# Altium footprint library 3M THD.PcbLib: 163 footprints (part 8 of 14)
Each footprint in its own frame and in the unit in brackets; x right, y up, seen from the top. Pads: shape width x height; smd on the part's side, far side on the other; paste and mask are expansions set on the pad; w line width, h text height; cw(c..) or ccw(c..) is an arc to the next point about the centre after c.
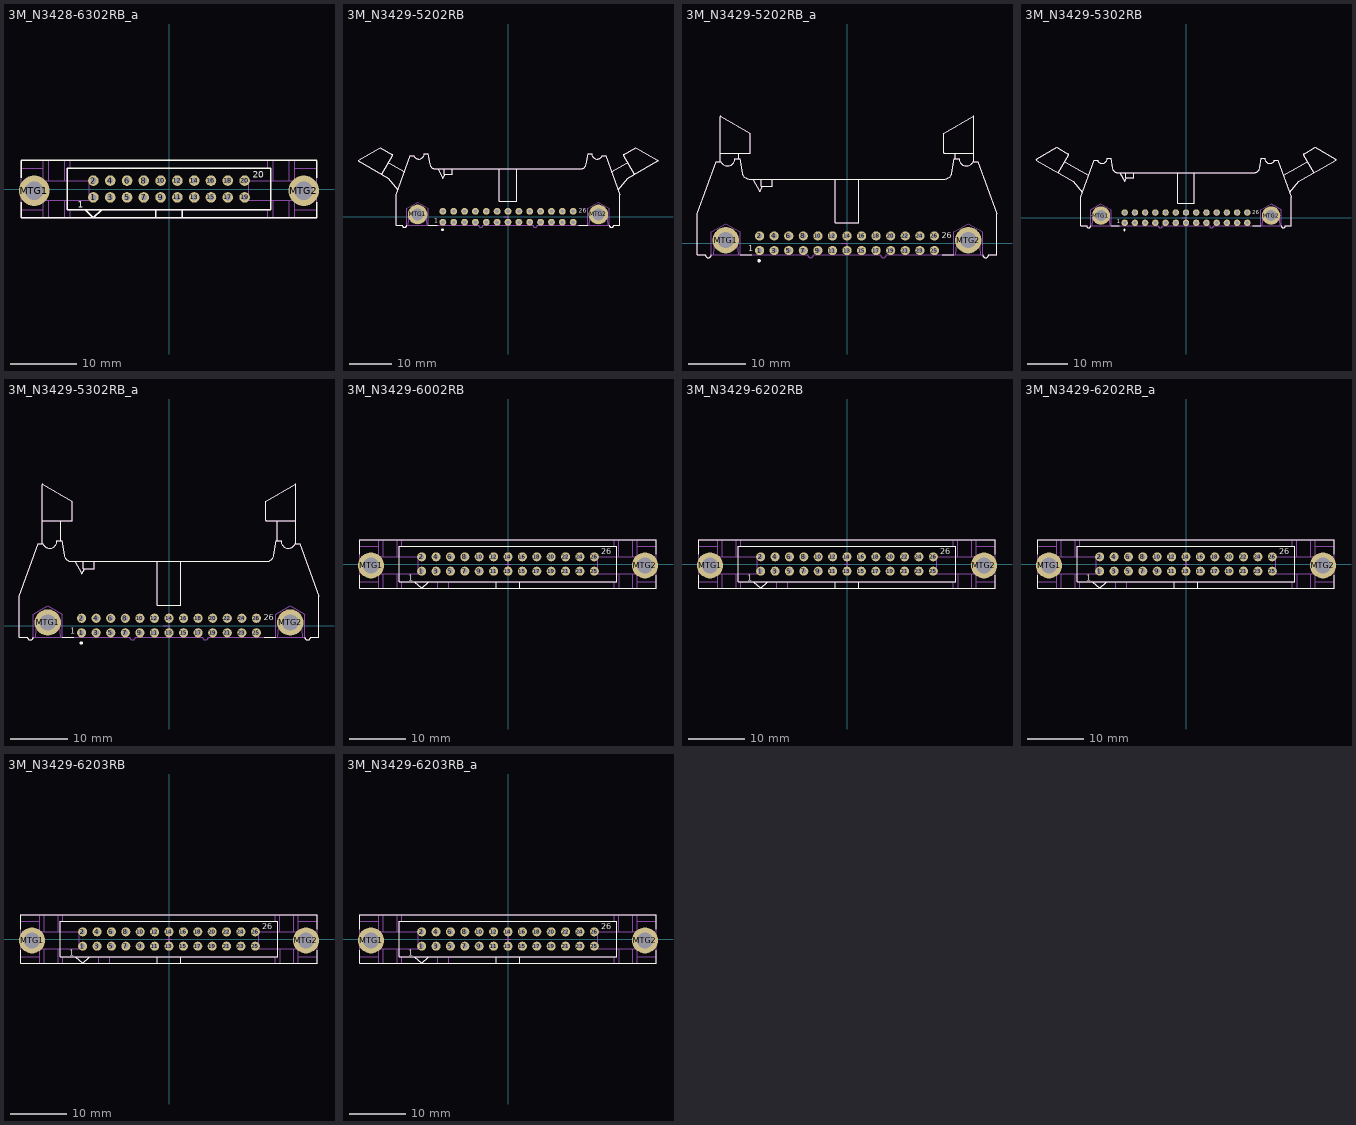
[diagram p7: the footprints below, top view; thin cyan lines are the x and y axes]

## 3M_N3428-6302RB_a [mm] "3M, 3000 Series, 20 Contacts - Pitch 2.54mm - Straight Four-Wall Header (Black) With Long Roll Pin Latch/Ejectors"
height 27.2
pads (22):
  round 1.6 hole 0.9: 1(-11.43,-1.27) 2(-11.43,1.27) 3(-8.89,-1.27) 4(-8.89,1.27) 5(-6.35,-1.27) 6(-6.35,1.27) 7(-3.81,-1.27) 8(-3.81,1.27) 9(-1.27,-1.27) 10(-1.27,1.27) 11(1.27,-1.27) 12(1.27,1.27) 13(3.81,-1.27) 14(3.81,1.27) 15(6.35,-1.27) 16(6.35,1.27) 17(8.89,-1.27) 18(8.89,1.27) 19(11.43,-1.27) 20(11.43,1.27)
  round 4.6 hole 2.8: MTG1(-20.384,-0.254) MTG2(20.384,-0.254)
Top Overlay:
  lines w0.2: -22.352,-2 -22.352,-4.318 22.352,-4.318 22.352,-2 ; -22.352,1.7 -22.352,4.3 ; -22.352,4.318 22.352,4.318 ; -12.7,-3.175 -11.43,-4.318 -10.16,-3.175 ; -2.032,-4.318 -2.032,-3.175 ; 2.032,-4.318 2.032,-3.175 ; 22.352,1.7 22.352,4.3 ; -15.367,-3.175 15.367,-3.175 15.367,3.175 -15.367,3.175 -15.367,-3.175
  text "1" at -13.767,-2.871 h1.02
  text "20" at 12.665,1.727 h1.02
Mechanical 14:
  circle w0.1: c-20.384,-0.254 r1.27
  circle w0.1: c20.384,-0.254 r1.27
  lines w0.1: -22.352,-3.175 -19.024,-3.175 ; -21.384,-0.254 -20.384,-0.254 ; -20.384,-1.254 -20.384,-0.254 ; -20.384,0.746 -20.384,-0.254 ; -19.384,-0.254 -20.384,-0.254 ; -19.024,-4.318 -19.024,-1.727 -12.065,-1.727 -12.065,1.27 -19.024,1.27 -19.024,4.318 ; -18.182,-4.318 -18.182,-1.727 ; -18.182,1.27 -18.182,4.318 ; -15.749,-4.318 -15.748,-1.727 ; -15.367,-1.727 -15.367,-3.175 15.367,-3.175 15.367,-1.727 ; -15.367,1.27 -15.367,3.175 15.367,3.175 15.367,1.27 ; -2.032,-4.318 -2.032,-3.175 ; 2.032,-4.318 2.032,-3.175 ; 14.906,-4.318 14.906,-3.175 ; 14.906,3.175 14.906,4.318 ; 15.748,1.27 15.748,4.318 ; 15.789,-4.318 15.789,-1.727 ; 18.182,-4.318 18.182,-1.727 ; 18.182,1.27 18.182,4.318 ; 19.024,-4.318 19.024,-1.727 12.065,-1.727 12.065,1.27 19.024,1.27 19.024,4.318 ; 19.024,-3.175 22.352,-3.175 ; 19.024,3.175 22.352,3.175 ; 19.384,-0.254 20.384,-0.254 ; 20.384,-1.254 20.384,-0.254 ; 20.384,0.746 20.384,-0.254 ; 21.384,-0.254 20.384,-0.254 ; -22.352,-4.318 22.352,-4.318 22.352,4.318 -22.352,4.318 -22.352,-4.318 ; -22.352,3.175 -19.024,3.175 -22.352,3.175 ; -21.908,-1.134 -21.908,0.626 -20.384,1.506 -18.86,0.626 -18.86,-1.134 -20.384,-2.014 -21.908,-1.134 ; -15.748,1.27 -15.748,4.318 -15.748,1.27 ; -14.906,-4.318 -14.906,-3.175 -14.906,-4.318 ; -14.906,3.175 -14.906,4.318 -14.906,3.175 ; -12.7,-3.175 -11.43,-4.318 -10.16,-3.175 -12.7,-3.175 ; 18.86,-1.134 18.86,0.626 20.384,1.506 21.908,0.626 21.908,-1.134 20.384,-2.014 18.86,-1.134
  text "20" at 12.665,1.727 h1.02
  text "1" at -13.767,-2.871 h1.02
3D body "3M_N3428-6302RB_a.stp": height 27.18, standoff -2.84, extent -22.352,-4.318 22.352,4.318

## 3M_N3429-5202RB [mm] "3M, 3000 Series, 26 Contacts - Pitch 2.54mm - Right Angle Four-Wall Header (Black) With Short Roll Pin Latch/Ejectors"
height 8.6
pads (28):
  round 1.6 hole 0.9: 1(-15.24,-1.27) 2(-15.24,1.27) 3(-12.7,-1.27) 4(-12.7,1.27) 5(-10.16,-1.27) 6(-10.16,1.27) 7(-7.62,-1.27) 8(-7.62,1.27) 9(-5.08,-1.27) 10(-5.08,1.27) 11(-2.54,-1.27) 12(-2.54,1.27) 13(0,-1.27) 14(0,1.27) 15(2.54,-1.27) 16(2.54,1.27) 17(5.08,-1.27) 18(5.08,1.27) 19(7.62,-1.27) 20(7.62,1.27) 21(10.16,-1.27) 22(10.16,1.27) 23(12.7,-1.27) 24(12.7,1.27) 25(15.24,-1.27) 26(15.24,1.27)
  round 4.6 hole 2.8: MTG1(-21.146,0.533) MTG2(21.146,0.533)
Top Overlay:
  circle w0.3: c-15.313,-3.048 r0.15
  lines w0.2: -29.561,9.892 -26.983,14.358 ccw(c-27.071,14.409) -27.02,14.497 -29.935,16.179 -35.04,13.232 ccw(c-34.989,13.144) -35.04,13.056 -28.051,9.02 -25.74,6.266 ; -27.948,12.686 -24.192,10.517 ; -24.702,-2.009 -26.162,-2.007 -26.162,5.105 -22.834,14.249 -21.992,14.249 ccw(c-20.828,14.757) -19.558,14.756 -18.716,14.757 -18.274,12.251 ccw(c-17.023,12.471) -17.023,11.201 17.023,11.201 ccw(c17.023,12.471) 18.274,12.251 18.716,14.757 19.558,14.757 ccw(c20.828,14.757) 21.992,14.249 22.834,14.249 26.162,5.105 26.162,-2.007 24.702,-2.007 cw(c24.194,-2.007) 23.686,-2.007 ; -24.702,-2.007 ccw(c-24.194,-2.007) -23.686,-2.007 ; -18.644,-1.999 -16.6,-2.005 ; -16.478,11.201 -15.208,9.002 -14.671,9.931 ; -14.929,11.201 -14.929,9.931 -13.011,9.931 -13.011,11.201 ; -2.032,11.201 -2.032,3.581 2.032,3.581 2.032,11.201 ; 16.6,-2.005 18.644,-2.005 ; 24.192,10.517 27.948,12.686 ; 25.74,6.266 28.051,9.02 35.04,13.056 ccw(c34.989,13.144) 35.04,13.232 29.935,16.179 27.02,14.497 ccw(c27.071,14.409) 26.983,14.358 29.561,9.892
  text "26" at 16.5,0.889 h1.02
  text "1" at -17.2,-1.399 h1.02
Mechanical 8:
  circle w0.05: c15.24,1.27 r0.5
  circle w0.05: c12.7,1.27 r0.5
  circle w0.05: c10.16,1.27 r0.5
  circle w0.05: c7.62,1.27 r0.5
  circle w0.05: c5.08,1.27 r0.5
  circle w0.05: c2.54,1.27 r0.5
  circle w0.05: c0,1.27 r0.5
  circle w0.05: c-2.54,1.27 r0.5
  circle w0.05: c-5.08,1.27 r0.5
  circle w0.05: c-7.62,1.27 r0.5
  circle w0.05: c-10.16,1.27 r0.5
  circle w0.05: c-12.7,1.27 r0.5
  circle w0.05: c-15.24,1.27 r0.5
  circle w0.05: c-15.24,-1.27 r0.5
  circle w0.05: c-12.7,-1.27 r0.5
  circle w0.05: c-10.16,-1.27 r0.5
  circle w0.05: c-7.62,-1.27 r0.5
  circle w0.05: c-5.08,-1.27 r0.5
  circle w0.05: c-2.54,-1.27 r0.5
  circle w0.05: c0,-1.27 r0.5
  circle w0.05: c2.54,-1.27 r0.5
  circle w0.05: c5.08,-1.27 r0.5
  circle w0.05: c7.62,-1.27 r0.5
  circle w0.05: c10.16,-1.27 r0.5
  circle w0.05: c12.7,-1.27 r0.5
  circle w0.05: c15.24,-1.27 r0.5
  circle w0.1: c21.146,0.533 r1.3
  circle w0.05: c-21.146,0.533 r1.3
  lines w0.05: -1,0 0,0 0,-1
Mechanical 14:
  lines w0.1: -29.561,9.892 -26.983,14.358 ccw(c-27.071,14.409) -27.02,14.497 -29.935,16.179 -35.04,13.232 ccw(c-34.989,13.144) -35.04,13.056 -28.051,9.02 -25.74,6.266 ; -27.948,12.686 -24.192,10.517 ; -24.702,-2.009 -26.162,-2.007 -26.162,5.105 -22.834,14.249 -21.992,14.249 ccw(c-20.828,14.757) -19.558,14.756 -18.716,14.757 -18.274,12.251 ccw(c-17.023,12.471) -17.023,11.201 17.023,11.201 ccw(c17.023,12.471) 18.274,12.251 18.716,14.757 19.558,14.757 ccw(c20.828,14.757) 21.992,14.249 22.834,14.249 26.162,5.105 26.162,-2.007 24.702,-2.007 cw(c24.194,-2.007) 23.686,-2.007 6.858,-2.007 cw(c6.35,-2.007) 5.842,-2.007 -5.842,-2.007 cw(c-6.35,-2.007) -6.858,-2.007 -23.686,-2.007 cw(c-24.194,-2.007) -24.702,-2.007 ; -23.647,-2.007 -23.647,1.978 -21.146,3.422 -18.644,1.978 -18.644,-2.007 ; -23.28,-2.007 -23.043,0.699 cw(c-21.146,0.533) -19.248,0.699 -19.011,-2.007 ; -16.478,11.201 -15.208,9.002 -14.671,9.931 ; -14.929,11.201 -14.929,9.931 -13.011,9.931 -13.011,11.201 ; -2.032,11.201 -2.032,3.581 2.032,3.581 2.032,11.201 ; 18.644,-2.007 18.644,1.978 21.146,3.422 23.647,1.978 23.647,-2.007 ; 19.011,-2.007 19.248,0.699 cw(c21.146,0.533) 23.043,0.699 23.28,-2.007 ; 24.192,10.517 27.948,12.686 ; 25.74,6.266 28.051,9.02 35.04,13.056 ccw(c34.989,13.144) 35.04,13.232 29.935,16.179 27.02,14.497 ccw(c27.071,14.409) 26.983,14.358 29.561,9.892
  text "26" at 16.5,0.889 h1.02
  text "1" at -17.2,-1.399 h1.02
3D body "3M_N3429-5202RB.stp": height 8.64, standoff -2.84, extent -35.091,-2.513 35.091,16.181

## 3M_N3429-5202RB_a [mm] "3M, 3000 Series, 26 Contacts - Pitch 2.54mm - Right Angle Four-Wall Header (Black) With Short Roll Pin Latch/Ejectors"
height 8.6
pads (28):
  round 1.6 hole 0.9: 1(-15.24,-1.27) 2(-15.24,1.27) 3(-12.7,-1.27) 4(-12.7,1.27) 5(-10.16,-1.27) 6(-10.16,1.27) 7(-7.62,-1.27) 8(-7.62,1.27) 9(-5.08,-1.27) 10(-5.08,1.27) 11(-2.54,-1.27) 12(-2.54,1.27) 13(0,-1.27) 14(0,1.27) 15(2.54,-1.27) 16(2.54,1.27) 17(5.08,-1.27) 18(5.08,1.27) 19(7.62,-1.27) 20(7.62,1.27) 21(10.16,-1.27) 22(10.16,1.27) 23(12.7,-1.27) 24(12.7,1.27) 25(15.24,-1.27) 26(15.24,1.27)
  round 4.6 hole 2.8: MTG1(-21.146,0.533) MTG2(21.146,0.533)
Top Overlay:
  circle w0.3: c-15.313,-3.048 r0.15
  lines w0.2: -24.702,-2.009 -26.162,-2.007 -26.162,5.105 -22.834,14.249 -21.992,14.249 ccw(c-20.828,14.757) -19.558,14.756 -18.716,14.757 -18.274,12.251 ccw(c-17.023,12.471) -17.023,11.201 17.023,11.201 ccw(c17.023,12.471) 18.274,12.251 18.716,14.757 19.558,14.757 ccw(c20.828,14.757) 21.992,14.249 22.834,14.249 26.162,5.105 26.162,-2.007 24.702,-2.007 cw(c24.194,-2.007) 23.686,-2.007 ; -24.702,-2.007 ccw(c-24.194,-2.007) -23.686,-2.007 ; -22.149,14.249 -22.149,22.024 cw(c-22.047,22.024) -21.996,22.112 -16.891,19.164 -16.891,15.799 cw(c-16.993,15.799) -16.993,15.697 -22.149,15.697 ; -18.923,14.757 -18.923,15.697 ; -18.644,-1.999 -16.6,-2.005 ; -16.478,11.201 -15.208,9.002 -14.671,9.931 ; -14.929,11.201 -14.929,9.931 -13.011,9.931 -13.011,11.201 ; -2.032,11.201 -2.032,3.581 2.032,3.581 2.032,11.201 ; 16.6,-2.005 18.644,-2.005 ; 18.923,14.757 18.923,15.697 ; 22.149,14.249 22.149,22.024 ccw(c22.047,22.024) 21.996,22.112 16.891,19.164 16.891,15.799 ccw(c16.993,15.799) 16.993,15.697 22.149,15.697
  text "1" at -17.2,-1.399 h1.02
  text "26" at 16.5,0.889 h1.02
Mechanical 8:
  circle w0.05: c15.24,1.27 r0.5
  circle w0.05: c12.7,1.27 r0.5
  circle w0.05: c10.16,1.27 r0.5
  circle w0.05: c7.62,1.27 r0.5
  circle w0.05: c5.08,1.27 r0.5
  circle w0.05: c2.54,1.27 r0.5
  circle w0.05: c0,1.27 r0.5
  circle w0.05: c-2.54,1.27 r0.5
  circle w0.05: c-5.08,1.27 r0.5
  circle w0.05: c-7.62,1.27 r0.5
  circle w0.05: c-10.16,1.27 r0.5
  circle w0.05: c-12.7,1.27 r0.5
  circle w0.05: c-15.24,1.27 r0.5
  circle w0.05: c-15.24,-1.27 r0.5
  circle w0.05: c-12.7,-1.27 r0.5
  circle w0.05: c-10.16,-1.27 r0.5
  circle w0.05: c-7.62,-1.27 r0.5
  circle w0.05: c-5.08,-1.27 r0.5
  circle w0.05: c-2.54,-1.27 r0.5
  circle w0.05: c0,-1.27 r0.5
  circle w0.05: c2.54,-1.27 r0.5
  circle w0.05: c5.08,-1.27 r0.5
  circle w0.05: c7.62,-1.27 r0.5
  circle w0.05: c10.16,-1.27 r0.5
  circle w0.05: c12.7,-1.27 r0.5
  circle w0.05: c15.24,-1.27 r0.5
  circle w0.1: c21.146,0.533 r1.3
  circle w0.05: c-21.146,0.533 r1.3
  lines w0.05: -1,0 0,0 0,-1
Mechanical 14:
  lines w0.1: -24.702,-2.009 -26.162,-2.007 -26.162,5.105 -22.834,14.249 -21.992,14.249 ccw(c-20.828,14.757) -19.558,14.756 -18.716,14.757 -18.274,12.251 ccw(c-17.023,12.471) -17.023,11.201 17.023,11.201 ccw(c17.023,12.471) 18.274,12.251 18.716,14.757 19.558,14.757 ccw(c20.828,14.757) 21.992,14.249 22.834,14.249 26.162,5.105 26.162,-2.007 24.702,-2.007 cw(c24.194,-2.007) 23.686,-2.007 6.858,-2.007 cw(c6.35,-2.007) 5.842,-2.007 -5.842,-2.007 cw(c-6.35,-2.007) -6.858,-2.007 -23.686,-2.007 cw(c-24.194,-2.007) -24.702,-2.007 ; -23.647,-2.007 -23.647,1.978 -21.146,3.422 -18.644,1.978 -18.644,-2.007 ; -23.28,-2.007 -23.043,0.699 cw(c-21.146,0.533) -19.248,0.699 -19.011,-2.007 ; -22.149,14.249 -22.149,22.024 cw(c-22.047,22.024) -21.996,22.112 -16.891,19.164 -16.891,15.799 cw(c-16.993,15.799) -16.993,15.697 -22.149,15.697 ; -18.923,14.757 -18.923,15.697 ; -16.478,11.201 -15.208,9.002 -14.671,9.931 ; -14.929,11.201 -14.929,9.931 -13.011,9.931 -13.011,11.201 ; -2.032,11.201 -2.032,3.581 2.032,3.581 2.032,11.201 ; 18.644,-2.007 18.644,1.978 21.146,3.422 23.647,1.978 23.647,-2.007 ; 18.923,14.757 18.923,15.697 ; 19.011,-2.007 19.248,0.699 cw(c21.146,0.533) 23.043,0.699 23.28,-2.007 ; 22.149,14.249 22.149,22.024 ccw(c22.047,22.024) 21.996,22.112 16.891,19.164 16.891,15.799 ccw(c16.993,15.799) 16.993,15.697 22.149,15.697
  text "1" at -17.2,-1.399 h1.02
  text "26" at 16.5,0.889 h1.02
3D body "3M_N3429-5202RB_a.stp": height 8.64, standoff -2.84, extent -26.162,-2.513 26.162,22.127

## 3M_N3429-5302RB [mm] "3M, 3000 Series, 26 Contacts - Pitch 2.54mm - Right Angle Four-Wall Header (Black) With Long Roll Pin Latch/Ejectors"
height 8.6
pads (28):
  round 1.6 hole 0.9: 1(-15.24,-1.27) 2(-15.24,1.27) 3(-12.7,-1.27) 4(-12.7,1.27) 5(-10.16,-1.27) 6(-10.16,1.27) 7(-7.62,-1.27) 8(-7.62,1.27) 9(-5.08,-1.27) 10(-5.08,1.27) 11(-2.54,-1.27) 12(-2.54,1.27) 13(0,-1.27) 14(0,1.27) 15(2.54,-1.27) 16(2.54,1.27) 17(5.08,-1.27) 18(5.08,1.27) 19(7.62,-1.27) 20(7.62,1.27) 21(10.16,-1.27) 22(10.16,1.27) 23(12.7,-1.27) 24(12.7,1.27) 25(15.24,-1.27) 26(15.24,1.27)
  round 4.6 hole 2.8: MTG1(-21.146,0.533) MTG2(21.146,0.533)
Top Overlay:
  circle w0.3: c-15.313,-3.048 r0.15
  lines w0.2: -31.759,11.161 -29.181,15.627 ccw(c-29.269,15.677) -29.218,15.765 -32.132,17.448 -37.238,14.5 ccw(c-37.187,14.412) -37.238,14.324 -28.051,9.02 -25.74,6.266 ; -30.146,13.955 -24.192,10.517 ; -23.686,-2.007 cw(c-24.194,-2.007) -24.702,-2.007 -26.162,-2.007 -26.162,5.105 -22.834,14.249 -21.992,14.249 ccw(c-20.828,14.757) -19.558,14.756 -18.716,14.757 -18.274,12.251 ccw(c-17.023,12.471) -17.023,11.201 17.023,11.201 ccw(c17.023,12.471) 18.274,12.251 18.716,14.757 19.558,14.757 ccw(c20.828,14.757) 21.992,14.249 22.834,14.249 26.162,5.105 26.162,-2.007 24.702,-2.007 cw(c24.194,-2.007) 23.686,-2.007 ; -18.644,-2 -16.6,-2.007 ; -16.478,11.201 -15.208,9.002 -14.671,9.931 ; -14.929,11.201 -14.929,9.931 -13.011,9.931 -13.011,11.201 ; -2.032,11.201 -2.032,3.581 2.032,3.581 2.032,11.201 ; 16.6,-2.007 18.644,-2.007 ; 24.192,10.517 30.146,13.955 ; 25.74,6.266 28.051,9.02 37.238,14.324 ccw(c37.187,14.412) 37.238,14.5 32.132,17.448 29.218,15.765 ccw(c29.269,15.677) 29.181,15.627 31.759,11.161
  text "1" at -17.2,-1.4 h1.02
  text "26" at 16.5,0.889 h1.02
Mechanical 8:
  circle w0.05: c-21.146,0.533 r1.3
  circle w0.1: c21.146,0.533 r1.3
  circle w0.05: c15.24,-1.27 r0.5
  circle w0.05: c12.7,-1.27 r0.5
  circle w0.05: c10.16,-1.27 r0.5
  circle w0.05: c7.62,-1.27 r0.5
  circle w0.05: c5.08,-1.27 r0.5
  circle w0.05: c2.54,-1.27 r0.5
  circle w0.05: c0,-1.27 r0.5
  circle w0.05: c-2.54,-1.27 r0.5
  circle w0.05: c-5.08,-1.27 r0.5
  circle w0.05: c-7.62,-1.27 r0.5
  circle w0.05: c-10.16,-1.27 r0.5
  circle w0.05: c-12.7,-1.27 r0.5
  circle w0.05: c-15.24,-1.27 r0.5
  circle w0.05: c-15.24,1.27 r0.5
  circle w0.05: c-12.7,1.27 r0.5
  circle w0.05: c-10.16,1.27 r0.5
  circle w0.05: c-7.62,1.27 r0.5
  circle w0.05: c-5.08,1.27 r0.5
  circle w0.05: c-2.54,1.27 r0.5
  circle w0.05: c0,1.27 r0.5
  circle w0.05: c2.54,1.27 r0.5
  circle w0.05: c5.08,1.27 r0.5
  circle w0.05: c7.62,1.27 r0.5
  circle w0.05: c10.16,1.27 r0.5
  circle w0.05: c12.7,1.27 r0.5
  circle w0.05: c15.24,1.27 r0.5
  lines w0.05: 0,0 0,-1 0,0 ; 0,0 -1,0 0,0
Mechanical 14:
  lines w0.1: -31.759,11.161 -29.181,15.627 ccw(c-29.269,15.677) -29.218,15.765 -32.132,17.448 -37.238,14.5 ccw(c-37.187,14.412) -37.238,14.324 -28.051,9.02 -25.74,6.266 ; -30.146,13.955 -24.192,10.517 ; -23.647,-2.007 -23.647,1.978 -21.146,3.422 -18.644,1.978 -18.644,-2.007 ; -23.28,-2.007 -23.043,0.699 cw(c-21.146,0.533) -19.248,0.699 -19.011,-2.007 ; -16.478,11.201 -15.208,9.002 -14.671,9.931 ; -14.929,11.201 -14.929,9.931 -13.011,9.931 -13.011,11.201 ; -2.032,11.201 -2.032,3.581 2.032,3.581 2.032,11.201 ; 18.644,-2.007 18.644,1.978 21.146,3.422 23.647,1.978 23.647,-2.007 ; 19.011,-2.007 19.248,0.699 cw(c21.146,0.533) 23.043,0.699 23.28,-2.007 ; 24.192,10.517 30.146,13.955 ; 25.74,6.266 28.051,9.02 37.238,14.324 ccw(c37.187,14.412) 37.238,14.5 32.132,17.448 29.218,15.765 ccw(c29.269,15.677) 29.181,15.627 31.759,11.161 ; -26.162,-2.007 -26.162,5.105 -22.834,14.249 -21.992,14.249 ccw(c-20.828,14.757) -19.558,14.756 -18.716,14.757 -18.274,12.251 ccw(c-17.023,12.471) -17.023,11.201 17.023,11.201 ccw(c17.023,12.471) 18.274,12.251 18.716,14.757 19.558,14.757 ccw(c20.828,14.757) 21.992,14.249 22.834,14.249 26.162,5.105 26.162,-2.007 24.702,-2.007 cw(c24.194,-2.007) 23.686,-2.007 6.858,-2.007 cw(c6.35,-2.007) 5.842,-2.007 -5.842,-2.007 cw(c-6.35,-2.007) -6.858,-2.007 -23.686,-2.007 cw(c-24.194,-2.007) -24.702,-2.007 -26.162,-2.007
  text "1" at -17.2,-1.4 h1.02
  text "26" at 16.5,0.889 h1.02
3D body "3M_N3429-5302RB.stp": height 8.64, standoff -2.84, extent -37.288,-2.514 37.289,17.448

## 3M_N3429-5302RB_a [mm] "3M, 3000 Series, 26 Contacts - Pitch 2.54mm - Right Angle Four-Wall Header (Black) With Long Roll Pin Latch/Ejectors"
height 8.6
pads (28):
  round 1.6 hole 0.9: 1(-15.24,-1.27) 2(-15.24,1.27) 3(-12.7,-1.27) 4(-12.7,1.27) 5(-10.16,-1.27) 6(-10.16,1.27) 7(-7.62,-1.27) 8(-7.62,1.27) 9(-5.08,-1.27) 10(-5.08,1.27) 11(-2.54,-1.27) 12(-2.54,1.27) 13(0,-1.27) 14(0,1.27) 15(2.54,-1.27) 16(2.54,1.27) 17(5.08,-1.27) 18(5.08,1.27) 19(7.62,-1.27) 20(7.62,1.27) 21(10.16,-1.27) 22(10.16,1.27) 23(12.7,-1.27) 24(12.7,1.27) 25(15.24,-1.27) 26(15.24,1.27)
  round 4.6 hole 2.8: MTG1(-21.146,0.533) MTG2(21.146,0.533)
Top Overlay:
  circle w0.3: c-15.313,-3.048 r0.15
  lines w0.2: -23.686,-2.007 cw(c-24.194,-2.007) -24.702,-2.007 -26.162,-2.007 -26.162,5.105 -22.834,14.249 -21.992,14.249 ccw(c-20.828,14.757) -19.558,14.756 -18.716,14.757 -18.274,12.251 ccw(c-17.023,12.471) -17.023,11.201 17.023,11.201 ccw(c17.023,12.471) 18.274,12.251 18.716,14.757 19.558,14.757 ccw(c20.828,14.757) 21.992,14.249 22.834,14.249 26.162,5.105 26.162,-2.007 24.702,-2.007 cw(c24.194,-2.007) 23.686,-2.007 ; -22.149,14.249 -22.149,24.561 cw(c-22.047,24.561) -21.996,24.649 -16.891,21.702 -16.891,18.336 cw(c-16.993,18.336) -16.993,18.235 -22.149,18.235 ; -18.923,14.757 -18.923,18.235 ; -18.644,-2 -16.6,-2.007 ; -16.478,11.201 -15.208,9.002 -14.671,9.931 ; -14.929,11.201 -14.929,9.931 -13.011,9.931 -13.011,11.201 ; -2.032,11.201 -2.032,3.581 2.032,3.581 2.032,11.201 ; 16.6,-2.007 18.644,-2.007 ; 18.923,14.757 18.923,18.235 ; 22.149,14.249 22.149,24.561 ccw(c22.047,24.561) 21.996,24.649 16.891,21.702 16.891,18.336 ccw(c16.993,18.336) 16.993,18.235 22.149,18.235
  text "26" at 16.5,0.889 h1.02
  text "1" at -17.2,-1.4 h1.02
Mechanical 8:
  circle w0.05: c15.24,1.27 r0.5
  circle w0.05: c12.7,1.27 r0.5
  circle w0.05: c10.16,1.27 r0.5
  circle w0.05: c7.62,1.27 r0.5
  circle w0.05: c5.08,1.27 r0.5
  circle w0.05: c2.54,1.27 r0.5
  circle w0.05: c0,1.27 r0.5
  circle w0.05: c-2.54,1.27 r0.5
  circle w0.05: c-5.08,1.27 r0.5
  circle w0.05: c-7.62,1.27 r0.5
  circle w0.05: c-10.16,1.27 r0.5
  circle w0.05: c-12.7,1.27 r0.5
  circle w0.05: c-15.24,1.27 r0.5
  circle w0.05: c-15.24,-1.27 r0.5
  circle w0.05: c-12.7,-1.27 r0.5
  circle w0.05: c-10.16,-1.27 r0.5
  circle w0.05: c-7.62,-1.27 r0.5
  circle w0.05: c-5.08,-1.27 r0.5
  circle w0.05: c-2.54,-1.27 r0.5
  circle w0.05: c0,-1.27 r0.5
  circle w0.05: c2.54,-1.27 r0.5
  circle w0.05: c5.08,-1.27 r0.5
  circle w0.05: c7.62,-1.27 r0.5
  circle w0.05: c10.16,-1.27 r0.5
  circle w0.05: c12.7,-1.27 r0.5
  circle w0.05: c15.24,-1.27 r0.5
  circle w0.1: c21.146,0.533 r1.3
  circle w0.05: c-21.146,0.533 r1.3
  lines w0.05: 0,0 0,-1 0,0 ; 0,0 -1,0 0,0
Mechanical 14:
  lines w0.1: -23.647,-2.007 -23.647,1.978 -21.146,3.422 -18.644,1.978 -18.644,-2.007 ; -23.28,-2.007 -23.043,0.699 cw(c-21.146,0.533) -19.248,0.699 -19.011,-2.007 ; -22.149,14.249 -22.149,24.561 cw(c-22.047,24.561) -21.996,24.649 -16.891,21.702 -16.891,18.336 cw(c-16.993,18.336) -16.993,18.235 -22.149,18.235 ; -18.923,14.757 -18.923,18.235 ; -16.478,11.201 -15.208,9.002 -14.671,9.931 ; -14.929,11.201 -14.929,9.931 -13.011,9.931 -13.011,11.201 ; -2.032,11.201 -2.032,3.581 2.032,3.581 2.032,11.201 ; 18.644,-2.007 18.644,1.978 21.146,3.422 23.647,1.978 23.647,-2.007 ; 18.923,14.757 18.923,18.235 ; 19.011,-2.007 19.248,0.699 cw(c21.146,0.533) 23.043,0.699 23.28,-2.007 ; 22.149,14.249 22.149,24.561 ccw(c22.047,24.561) 21.996,24.649 16.891,21.702 16.891,18.336 ccw(c16.993,18.336) 16.993,18.235 22.149,18.235 ; -26.162,-2.007 -24.702,-2.007 ccw(c-24.194,-2.007) -23.686,-2.007 -6.858,-2.007 ccw(c-6.35,-2.007) -5.842,-2.007 5.842,-2.007 ccw(c6.35,-2.007) 6.858,-2.007 23.686,-2.007 ccw(c24.194,-2.007) 24.702,-2.007 26.162,-2.007 26.162,5.105 22.834,14.249 21.992,14.249 cw(c20.828,14.757) 19.558,14.757 18.716,14.757 18.274,12.251 cw(c17.023,12.471) 17.023,11.201 -17.023,11.201 cw(c-17.023,12.471) -18.274,12.251 -18.716,14.757 -19.558,14.756 cw(c-20.828,14.757) -21.992,14.249 -22.834,14.249 -26.162,5.105 -26.162,-2.007
  text "26" at 16.5,0.889 h1.02
  text "1" at -17.2,-1.4 h1.02
3D body "3M_N3429-5302RB_a.stp": height 8.64, standoff -2.84, extent -26.162,-2.514 26.162,24.663

## 3M_N3429-6002RB [mm] "3M, 3000 Series, 26 Contacts - Pitch 2.54mm - Straight Four-Wall Header (Black) Without Roll Pin Latch/Ejectors"
height 24.6
pads (28):
  round 1.6 hole 0.9: 1(-15.24,-1.27) 2(-15.24,1.27) 3(-12.7,-1.27) 4(-12.7,1.27) 5(-10.16,-1.27) 6(-10.16,1.27) 7(-7.62,-1.27) 8(-7.62,1.27) 9(-5.08,-1.27) 10(-5.08,1.27) 11(-2.54,-1.27) 12(-2.54,1.27) 13(0,-1.27) 14(0,1.27) 15(2.54,-1.27) 16(2.54,1.27) 17(5.08,-1.27) 18(5.08,1.27) 19(7.62,-1.27) 20(7.62,1.27) 21(10.16,-1.27) 22(10.16,1.27) 23(12.7,-1.27) 24(12.7,1.27) 25(15.24,-1.27) 26(15.24,1.27)
  round 4.6 hole 2.8: MTG1(-24.18,-0.25) MTG2(24.18,-0.25)
Top Overlay:
  lines w0.2: -26.162,-2 -26.162,-4.318 26.162,-4.318 26.162,-2 ; -26.162,1.7 -26.162,4.3 ; -26.162,4.318 26.162,4.318 ; -2.032,-4.318 -2.032,-3.175 ; 2.032,-4.318 2.032,-3.175 ; 26.162,1.7 26.162,4.3 ; -19.177,-3.175 -19.177,3.175 19.177,3.175 19.177,-3.175 -19.177,-3.175 ; -16.51,-3.175 -15.24,-4.318 -13.97,-3.175 -16.51,-3.175
  text "26" at 16.475,1.727 h1.02
  text "1" at -17.577,-2.921 h1.02
Mechanical 8:
  lines w0.1: -24.68,-0.25 -24.18,-0.25 ; -24.18,-0.75 -24.18,-0.25 ; -24.18,0.25 -24.18,-0.25 ; -23.68,-0.25 -24.18,-0.25 ; -15.74,-1.27 -15.24,-1.27 ; -15.74,1.27 -15.24,1.27 ; -15.24,-1.77 -15.24,-1.27 ; -15.24,-0.77 -15.24,-1.27 ; -15.24,0.77 -15.24,1.27 ; -15.24,1.77 -15.24,1.27 ; -14.74,-1.27 -15.24,-1.27 ; -14.74,1.27 -15.24,1.27 ; -13.2,-1.27 -12.7,-1.27 ; -13.2,1.27 -12.7,1.27 ; -12.7,-1.77 -12.7,-1.27 ; -12.7,-0.77 -12.7,-1.27 ; -12.7,0.77 -12.7,1.27 ; -12.7,1.77 -12.7,1.27 ; -12.2,-1.27 -12.7,-1.27 ; -12.2,1.27 -12.7,1.27 ; -10.66,-1.27 -10.16,-1.27 ; -10.66,1.27 -10.16,1.27 ; -10.16,-1.77 -10.16,-1.27 ; -10.16,-0.77 -10.16,-1.27 ; -10.16,0.77 -10.16,1.27 ; -10.16,1.77 -10.16,1.27 ; -9.66,-1.27 -10.16,-1.27 ; -9.66,1.27 -10.16,1.27 ; -8.12,-1.27 -7.62,-1.27 ; -8.12,1.27 -7.62,1.27 ; -7.62,-1.77 -7.62,-1.27 ; -7.62,-0.77 -7.62,-1.27 ; -7.62,0.77 -7.62,1.27 ; -7.62,1.77 -7.62,1.27 ; -7.12,-1.27 -7.62,-1.27 ; -7.12,1.27 -7.62,1.27 ; -5.58,-1.27 -5.08,-1.27 ; -5.58,1.27 -5.08,1.27 ; -5.08,-1.77 -5.08,-1.27 ; -5.08,-0.77 -5.08,-1.27 ; -5.08,0.77 -5.08,1.27 ; -5.08,1.77 -5.08,1.27 ; -4.58,-1.27 -5.08,-1.27 ; -4.58,1.27 -5.08,1.27 ; -3.04,-1.27 -2.54,-1.27 ; -3.04,1.27 -2.54,1.27 ; -2.54,-1.77 -2.54,-1.27 ; -2.54,-0.77 -2.54,-1.27 ; -2.54,0.77 -2.54,1.27 ; -2.54,1.77 -2.54,1.27 ; -2.04,-1.27 -2.54,-1.27 ; -2.04,1.27 -2.54,1.27 ; -0.5,-1.27 0,-1.27 ; -0.5,0 0,0 ; -0.5,1.27 0,1.27 ; 0,-1.77 0,-1.27 ; 0,-0.77 0,-1.27 ; 0,-0.5 0,0 ; 0,0.5 0,0 ; 0,0.77 0,1.27 ; 0,1.77 0,1.27 ; 0.5,-1.27 0,-1.27 ; 0.5,0 0,0 ; 0.5,1.27 0,1.27 ; 2.04,-1.27 2.54,-1.27 ; 2.04,1.27 2.54,1.27 ; 2.54,-1.77 2.54,-1.27 ; 2.54,-0.77 2.54,-1.27 ; 2.54,0.77 2.54,1.27 ; 2.54,1.77 2.54,1.27 ; 3.04,-1.27 2.54,-1.27 ; 3.04,1.27 2.54,1.27 ; 4.58,-1.27 5.08,-1.27 ; 4.58,1.27 5.08,1.27 ; 5.08,-1.77 5.08,-1.27 ; 5.08,-0.77 5.08,-1.27 ; 5.08,0.77 5.08,1.27 ; 5.08,1.77 5.08,1.27 ; 5.58,-1.27 5.08,-1.27 ; 5.58,1.27 5.08,1.27 ; 7.12,-1.27 7.62,-1.27 ; 7.12,1.27 7.62,1.27 ; 7.62,-1.77 7.62,-1.27 ; 7.62,-0.77 7.62,-1.27 ; 7.62,0.77 7.62,1.27 ; 7.62,1.77 7.62,1.27 ; 8.12,-1.27 7.62,-1.27 ; 8.12,1.27 7.62,1.27 ; 9.66,-1.27 10.16,-1.27 ; 9.66,1.27 10.16,1.27 ; 10.16,-1.77 10.16,-1.27 ; 10.16,-0.77 10.16,-1.27 ; 10.16,0.77 10.16,1.27 ; 10.16,1.77 10.16,1.27 ; 10.66,-1.27 10.16,-1.27 ; 10.66,1.27 10.16,1.27 ; 12.2,-1.27 12.7,-1.27 ; 12.2,1.27 12.7,1.27 ; 12.7,-1.77 12.7,-1.27 ; 12.7,-0.77 12.7,-1.27 ; 12.7,0.77 12.7,1.27 ; 12.7,1.77 12.7,1.27 ; 13.2,-1.27 12.7,-1.27 ; 13.2,1.27 12.7,1.27 ; 14.74,-1.27 15.24,-1.27 ; 14.74,1.27 15.24,1.27 ; 15.24,-1.77 15.24,-1.27 ; 15.24,-0.77 15.24,-1.27 ; 15.24,0.77 15.24,1.27 ; 15.24,1.77 15.24,1.27 ; 15.74,-1.27 15.24,-1.27 ; 15.74,1.27 15.24,1.27 ; 23.68,-0.25 24.18,-0.25 ; 24.18,-0.75 24.18,-0.25 ; 24.18,0.25 24.18,-0.25 ; 24.68,-0.25 24.18,-0.25